# Altium footprint library ESKDPcbLib.PcbLib: 608 footprints (part 37 of 38)
Each footprint in its own frame and in the unit in brackets; x right, y up, seen from the top. Pads: shape width x height; smd on the part's side, far side on the other; paste and mask are expansions set on the pad; w line width, h text height; cw(c..) or ccw(c..) is an arc to the next point about the centre after c.
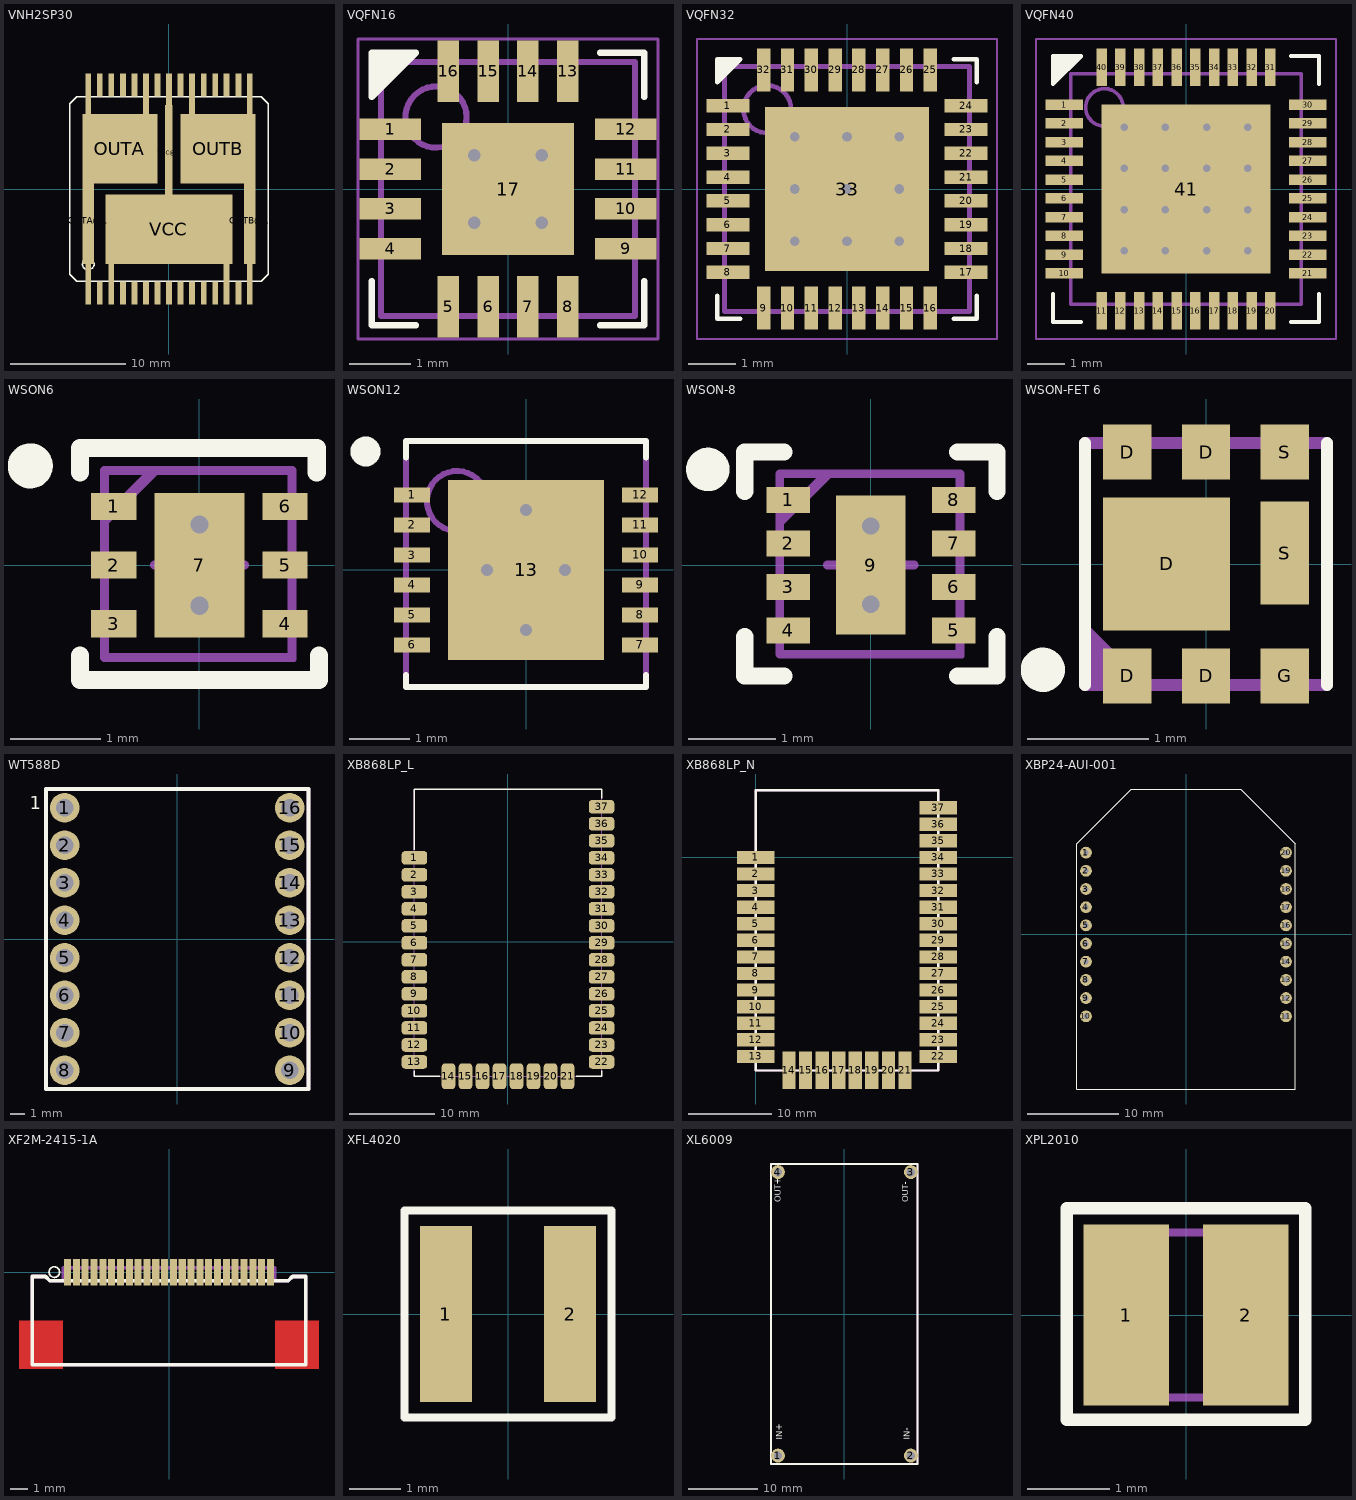
[diagram p36: the footprints below, top view; thin cyan lines are the x and y axes]

## VNH2SP30 [mil]
pads (36):
  rect 20x473 smd: 1(-275.59,-157.48) 15(276,-157.48) 16(276,158) 30(-275.59,158)
  rect 20x79 smd: 2(-236.22,-354.33) 4(-157.48,-354.33) 5(-118.11,-354.33) 6(-78.74,-354.33) 7(-39.37,-354.33) 8(0,-354.33) 9(40,-354.33) 10(79,-354.33) 11(119,-354.33) 12(158,-354.33) 14(237,-354.33) 17(237,355) 18(197,355) 19(158,355) 20(119,355) 22(40,355) 24(-39.37,355) 26(-118.11,355) 27(-157.48,355) 28(-196.85,355) 29(-236.22,355)
  rect 20x158 smd: 3(-196.85,-314.96) 13(197,-314.96) 21(79,315) 23(0,315) 25(-78.74,315)
  rect 256x237 smd: OUTA(-167.32,138) OUTB(168,138)
  rect 40x296 smd: OUTA@1(-275.59,-108.46) OUTB@1(276,-108.46)
  rect 434x237 smd: VCC(0,-137.8)
  rect 26x327 smd: VCC@1(0,124)
Top Overlay:
  circle w5: c-275.59,-255.91 r20
  lines w5: -338.58,-291.34 -314.96,-314.96 315,-314.96 339,-291.34 339,292 315,315 -314.96,315 -338.58,292 -338.58,-291.34
Top Paste:
  circle w0: c-236.22,217 r12
  circle w0: c-157.48,217 r12
  circle w0: c-78.74,217 r12
  circle w0: c79,217 r12
  circle w0: c158,217 r12
  circle w0: c237,217 r12
  circle w0: c-236.22,138 r12
  circle w0: c-157.48,138 r12
  circle w0: c-78.74,138 r12
  circle w0: c79,138 r12
  circle w0: c158,138 r12
  circle w0: c237,138 r12
  circle w0: c-236.22,60 r12
  circle w0: c-157.48,60 r12
  circle w0: c-78.74,60 r12
  circle w0: c79,60 r12
  circle w0: c158,60 r12
  circle w0: c237,60 r12
  circle w0: c-157.48,-59.06 r12
  circle w0: c-78.74,-59.06 r12
  circle w0: c0,-59.06 r12
  circle w0: c79,-59.06 r12
  circle w0: c158,-59.06 r12
  circle w0: c-157.48,-137.8 r12
  circle w0: c-78.74,-137.8 r12
  circle w0: c0,-137.8 r12
  circle w0: c79,-137.8 r12
  circle w0: c158,-137.8 r12
  circle w0: c-157.48,-216.54 r12
  circle w0: c-78.74,-216.54 r12
  circle w0: c0,-216.54 r12
  circle w0: c79,-216.54 r12
  circle w0: c158,-216.54 r12
  rectangle: -285.43,315 -265.75,394
  rectangle: -88.58,315 -68.9,394
  rectangle: -9.84,315 10,394
  rectangle: 69,315 89,394
  rectangle: 266,315 286,394
  region: -265.75,-314.76 -285.43,-314.76 -285.43,-393.5 -265.75,-393.5
  region: -187.01,-314.76 -206.69,-314.76 -206.69,-393.5 -187.01,-393.5
  region: 207,-314.76 188,-314.76 188,-393.5 207,-393.5
  region: 286,-314.76 266,-314.76 266,-393.5 286,-393.5
Top Solder:
  circle w0: c-236.22,217 r16
  circle w0: c-157.48,217 r16
  circle w0: c-78.74,217 r16
  circle w0: c79,217 r16
  circle w0: c158,217 r16
  circle w0: c237,217 r16
  circle w0: c-236.22,138 r16
  circle w0: c-157.48,138 r16
  circle w0: c-78.74,138 r16
  circle w0: c79,138 r16
  circle w0: c158,138 r16
  circle w0: c237,138 r16
  circle w0: c-236.22,60 r16
  circle w0: c-157.48,60 r16
  circle w0: c-78.74,60 r16
  circle w0: c79,60 r16
  circle w0: c158,60 r16
  circle w0: c237,60 r16
  circle w0: c-157.48,-59.06 r16
  circle w0: c-78.74,-59.06 r16
  circle w0: c0,-59.06 r16
  circle w0: c79,-59.06 r16
  circle w0: c158,-59.06 r16
  circle w0: c-157.48,-137.8 r16
  circle w0: c-78.74,-137.8 r16
  circle w0: c0,-137.8 r16
  circle w0: c79,-137.8 r16
  circle w0: c158,-137.8 r16
  circle w0: c-157.48,-216.54 r16
  circle w0: c-78.74,-216.54 r16
  circle w0: c0,-216.54 r16
  circle w0: c79,-216.54 r16
  circle w0: c158,-216.54 r16
  rectangle: -289.37,311 -261.81,398
  rectangle: -92.52,311 -64.96,398
  rectangle: -13.78,311 14,398
  rectangle: 65,311 93,398
  rectangle: 262,311 290,398
  region: -261.81,-310.83 -289.37,-310.83 -289.37,-397.44 -261.81,-397.44
  region: -183.07,-310.83 -210.63,-310.83 -210.63,-397.44 -183.07,-397.44
  region: 211,-310.83 184,-310.83 184,-397.44 211,-397.44
  region: 290,-310.83 262,-310.83 262,-397.44 290,-397.44

## VQFN16 [mm]
height 1
pads (17):
  rect 1x0.35 smd mask+0.05: 1(-1.925,0.975) 2(-1.925,0.325) 3(-1.925,-0.325) 4(-1.925,-0.975) 9(1.925,-0.975) 10(1.925,-0.325) 11(1.925,0.325) 12(1.925,0.975)
  rect 0.35x1 smd mask+0.05: 5(-0.975,-1.925) 6(-0.325,-1.925) 7(0.325,-1.925) 8(0.975,-1.925) 13(0.975,1.925) 14(0.325,1.925) 15(-0.325,1.925) 16(-0.975,1.925)
  rect 2.16x2.16 smd mask+0.05: 17(0,0)
via 0.55,-0.55 diameter 0.5 hole 0.2
via -0.55,-0.55 diameter 0.5 hole 0.2
via 0.55,0.55 diameter 0.5 hole 0.2
via -0.55,0.55 diameter 0.5 hole 0.2
Top Overlay:
  region: -2.225,2.225 -2.225,1.5 -1.5,2.225
  lines w0.1: -2.225,-1.5 -2.225,-2.225 -1.5,-2.225 ; 1.5,-2.225 2.225,-2.225 2.225,-1.5 ; 1.5,2.225 2.225,2.225 2.225,1.5 ; -2.225,1.5 -1.5,2.225 -2.225,2.225 -2.225,1.5
Mechanical 7:
  circle w0.1: c-1.175,1.175 r0.5
  lines w0.1: -2.075,-2.075 2.075,-2.075 2.075,2.075 -2.075,2.075 -2.075,-2.075
Mechanical 15:
  lines w0.05: -2.45,-2.45 2.45,-2.45 2.45,2.45 -2.45,2.45 -2.45,-2.45
  lines w0.1: -0.5,0 0.5,0 ; 0,-0.5 0,0.5
3D body: height 1, standoff 0.05, extent -2.075,-2.075 2.075,2.075

## VQFN32 [mm]
height 1
pads (33):
  rect 0.9x0.28 smd mask+0.05: 1(-2.5,1.75) 2(-2.5,1.25) 3(-2.5,0.75) 4(-2.5,0.25) 5(-2.5,-0.25) 6(-2.5,-0.75) 7(-2.5,-1.25) 8(-2.5,-1.75) 17(2.5,-1.75) 18(2.5,-1.25) 19(2.5,-0.75) 20(2.5,-0.25) 21(2.5,0.25) 22(2.5,0.75) 23(2.5,1.25) 24(2.5,1.75)
  rect 0.28x0.9 smd mask+0.05: 9(-1.75,-2.5) 10(-1.25,-2.5) 11(-0.75,-2.5) 12(-0.25,-2.5) 13(0.25,-2.5) 14(0.75,-2.5) 15(1.25,-2.5) 16(1.75,-2.5) 25(1.75,2.5) 26(1.25,2.5) 27(0.75,2.5) 28(0.25,2.5) 29(-0.25,2.5) 30(-0.75,2.5) 31(-1.25,2.5) 32(-1.75,2.5)
  rect 3.45x3.45 smd mask+0.05: 33(0,0)
via 1.1,-1.1 diameter 0.5 hole 0.2
via 0,-1.1 diameter 0.5 hole 0.2
via -1.1,-1.1 diameter 0.5 hole 0.2
via 1.1,0 diameter 0.5 hole 0.2
via 0,0 diameter 0.5 hole 0.2
via -1.1,0 diameter 0.5 hole 0.2
via 1.1,1.1 diameter 0.5 hole 0.2
via 0,1.1 diameter 0.5 hole 0.2
via -1.1,1.1 diameter 0.5 hole 0.2
Top Overlay:
  region: -2.725,2.725 -2.24,2.725 -2.725,2.24
  lines w0.1: -2.725,-2.24 -2.725,-2.725 -2.24,-2.725 ; 2.24,-2.725 2.725,-2.725 2.725,-2.24 ; 2.24,2.725 2.725,2.725 2.725,2.24 ; -2.725,2.24 -2.24,2.725 -2.725,2.725 -2.725,2.24
Mechanical 7:
  circle w0.1: c-1.675,1.675 r0.5
  lines w0.1: -2.575,-2.575 2.575,-2.575 2.575,2.575 -2.575,2.575 -2.575,-2.575
Mechanical 15:
  lines w0.05: -3.15,-3.15 3.15,-3.15 3.15,3.15 -3.15,3.15 -3.15,-3.15
  lines w0.1: -0.5,0 0.5,0 ; 0,-0.5 0,0.5
3D body: height 1, standoff 0.05, extent -2.575,-2.575 2.575,2.575

## VQFN40 [mm]
height 1
pads (41):
  rect 1x0.28 smd mask+0.05: 1(-3.25,2.25) 2(-3.25,1.75) 3(-3.25,1.25) 4(-3.25,0.75) 5(-3.25,0.25) 6(-3.25,-0.25) 7(-3.25,-0.75) 8(-3.25,-1.25) 9(-3.25,-1.75) 10(-3.25,-2.25) 22(3.25,-1.75) 23(3.25,-1.25) 24(3.25,-0.75) 25(3.25,-0.25) 26(3.25,0.25) 27(3.25,0.75) 28(3.25,1.25) 29(3.25,1.75) 30(3.25,2.25)
  rect 0.28x1 smd mask+0.05: 11(-2.25,-3.25) 12(-1.75,-3.25) 13(-1.25,-3.25) 14(-0.75,-3.25) 15(-0.25,-3.25) 16(0.25,-3.25) 17(0.75,-3.25) 18(1.25,-3.25) 19(1.75,-3.25) 20(2.25,-3.25) 31(2.25,3.25) 32(1.75,3.25) 33(1.25,3.25) 34(0.75,3.25) 35(0.25,3.25) 36(-0.25,3.25) 37(-0.75,3.25) 38(-1.25,3.25) 39(-1.75,3.25) 40(-2.25,3.25)
  rect 1x0.28 smd: 21(3.25,-2.25)
  rect 4.5x4.5 smd mask+0.05: 41(0,0)
via 1.65,-1.65 diameter 0.5 hole 0.2
via 0.55,-1.65 diameter 0.5 hole 0.2
via -0.55,-1.65 diameter 0.5 hole 0.2
via -1.65,-1.65 diameter 0.5 hole 0.2
via 1.65,-0.55 diameter 0.5 hole 0.2
via 0.55,-0.55 diameter 0.5 hole 0.2
via -0.55,-0.55 diameter 0.5 hole 0.2
via -1.65,-0.55 diameter 0.5 hole 0.2
via 1.65,0.55 diameter 0.5 hole 0.2
via 0.55,0.55 diameter 0.5 hole 0.2
via -0.55,0.55 diameter 0.5 hole 0.2
via -1.65,0.55 diameter 0.5 hole 0.2
via 1.65,1.65 diameter 0.5 hole 0.2
via 0.55,1.65 diameter 0.5 hole 0.2
via -0.55,1.65 diameter 0.5 hole 0.2
via -1.65,1.65 diameter 0.5 hole 0.2
Top Overlay:
  region: -3.55,3.55 -2.8,3.55 -3.55,2.8
  lines w0.1: -3.55,-2.79 -3.55,-3.55 -2.79,-3.55 ; -3.55,2.79 -3.55,3.55 -2.79,3.55 -3.55,2.8 ; 2.79,-3.55 3.55,-3.55 3.55,-2.79 ; 2.79,3.55 3.55,3.55 3.55,2.79
Mechanical 7:
  circle w0.1: c-2.175,2.175 r0.5
  lines w0.1: -3.075,-3.075 3.075,-3.075 3.075,3.075 -3.075,3.075 -3.075,-3.075
Mechanical 15:
  lines w0.05: -4,-4 4,-4 4,4 -4,4 -4,-4
  lines w0.1: -0.5,0 0.5,0 ; 0,-0.5 0,0.5
3D body: height 1, standoff 0.05, extent -3.075,-3.075 3.075,3.075

## WSON6 [mm] "PSON, 8-Leads, Body 4x4mm, Pitch 0.8mm, NSC Recommended"
height 0.8
pads (7):
  rect 0.5x0.3 smd mask+0.051: 1(-0.95,0.65) 2(-0.95,0) 3(-0.95,-0.65) 4(0.95,-0.65) 5(0.95,0) 6(0.95,0.65)
  rect 1x1.6 smd mask+0.051: 7(0,0)
via 0,0.45 diameter 0.5 hole 0.2
via 0,-0.45 diameter 0.5 hole 0.2
Top Overlay:
  circle w0.25: c-1.875,1.1 r0.125
  lines w0.2: -1.325,-1 -1.325,-1.275 -1,-1.275 1.325,-1.275 1.325,-1 ; -1.325,1.025 -1.325,1.3 -0.825,1.3 ; -0.875,1.3 1.3,1.3 1.3,1.025
Mechanical 7:
  lines w0.05: -1.05,0.45 -0.45,1.05 ; -1.025,0.525 -0.525,1.025 -0.575,1.025 -1.025,0.575 ; -1.05,-1.05 1.05,-1.05 1.05,1.05 -1.05,1.05 -1.05,-1.05
  lines w0.1: -0.5,0 0.5,0 ; 0,-0.5 0,0.5
Mechanical 9:
  lines w0.1: -1.05,-1.025 1.025,-1.025 1.025,1.05 -1.05,1.05 -1.05,-1.025
Mechanical 10:
  text ".Comment" at -1.025,1.775 h0.6
  text ".Designator" at -1.175,-2 h0.6
3D body: height 0.8, standoff 0, extent -1.05,-1.05 1.05,1.05

## WSON12 [mm] "PSON, 14-Leads, Body 4x4mm, Pitch 0.5mm, NSC Recommended"
height 0.8
pads (13):
  rect 0.6x0.25 smd paste-0.125 mask+0.051: 1(-1.9,1.25) 2(-1.9,0.75) 3(-1.9,0.25) 4(-1.9,-0.25) 5(-1.9,-0.75) 6(-1.9,-1.25) 7(1.9,-1.25) 8(1.9,-0.75) 9(1.9,-0.25) 10(1.9,0.25) 11(1.9,0.75) 12(1.9,1.25)
  rect 2.6x3 smd paste-1.3 mask+0.051: 13(0,0)
via 0,1 diameter 0.5 hole 0.2
via 0,-1 diameter 0.5 hole 0.2
via -0.65,0 diameter 0.5 hole 0.2
via 0.65,0 diameter 0.5 hole 0.2
Top Overlay:
  circle w0.25: c-2.675,1.975 r0.125
  lines w0.1: -2,-1.75 -2,-1.95 2,-1.95 2,-1.75 ; -2,1.875 -2,2.15 2,2.15 2,1.875
Top Paste:
  rectangle: -1.15,0.1 -0.125,1.4
  rectangle: -1.15,-1.4 -0.125,-0.1
  region: 1.15,-0.1 0.125,-0.1 0.125,-1.4 1.15,-1.4
  region: 1.15,1.4 0.125,1.4 0.125,0.1 1.15,0.1
  rectangle: 1.625,1.125 2.175,1.375
  rectangle: 1.625,0.625 2.175,0.875
  rectangle: 1.625,0.125 2.175,0.375
  rectangle: 1.625,-0.375 2.175,-0.125
  rectangle: 1.625,-0.875 2.175,-0.625
  rectangle: 1.625,-1.375 2.175,-1.125
  rectangle: -2.175,-1.375 -1.625,-1.125
  rectangle: -2.175,-0.875 -1.625,-0.625
  rectangle: -2.175,-0.375 -1.625,-0.125
  rectangle: -2.175,0.125 -1.625,0.375
  rectangle: -2.175,0.625 -1.625,0.875
  rectangle: -2.175,1.125 -1.625,1.375
Mechanical 7:
  lines w0.1: -0.5,0 0.5,0 ; 0,-0.5 0,0.5 ; -2,-1.95 -2,2.15 2,2.15 2,-1.95 -2,-1.95
Mechanical 9:
  circle w0.1: c-1.15,1.15 r0.5
  lines w0.1: -2,-1.95 2,-1.95 2,2.15 -2,2.15 -2,-1.95
Mechanical 10:
  text ".Designator" at -0.925,-2.575 h0.7
  text ".Comment" at -0.85,2.475 h0.7
3D body: height 0.8, standoff 0, extent -2,-1.949 2,2.149

## WSON-8 [mm] "PSON, 8-Leads, Body 4x4mm, Pitch 0.8mm, NSC Recommended"
height 0.8
pads (9):
  rect 0.5x0.3 smd mask+0.051: 1(-0.95,0.75) 2(-0.95,0.25) 3(-0.95,-0.25) 4(-0.95,-0.75) 5(0.95,-0.75) 6(0.95,-0.25) 7(0.95,0.25) 8(0.95,0.75)
  rect 0.8x1.6 smd mask+0.051: 9(0,0)
via 0,-0.45 diameter 0.5 hole 0.2
via 0,0.45 diameter 0.5 hole 0.2
Top Overlay:
  circle w0.25: c-1.875,1.1 r0.125
  lines w0.2: -1.45,-0.825 -1.45,-1.275 -1,-1.275 ; -1.45,0.85 -1.45,1.3 -1,1.3 ; 1,-1.275 1.45,-1.275 1.45,-0.825 ; 1,1.3 1.45,1.3 1.45,0.85
Mechanical 7:
  lines w0.05: -1.05,0.45 -0.45,1.05 ; -1.025,0.525 -0.525,1.025 -0.575,1.025 -1.025,0.575 ; -1.05,-1.05 -1.05,1.05 1.05,1.05 1.05,-1.05 -1.05,-1.05
  lines w0.1: -0.5,0 0.5,0 ; 0,-0.5 0,0.5
Mechanical 9:
  lines w0.1: -1.05,-1.025 -1.05,1.05 1.025,1.05 1.025,-1.025 -1.05,-1.025
Mechanical 10:
  text ".Designator" at -1.175,-2 h0.6
  text ".Comment" at -1.025,1.775 h0.6
3D body: height 0.8, standoff 0, extent -1.05,-1.05 1.05,1.05

## WSON-FET 6 [mm]
height 0.8
pads (8):
  rect 0.4x0.455 smd mask+0.05: D(-0.65,-0.925) D(-0.65,0.925) D(0,-0.925) D(0,0.925) G(0.65,-0.925) S(0.65,0.925)
  rect 1.05x1.1 smd mask+0.05: D(-0.325,0)
  rect 0.4x0.85 smd mask+0.05: S(0.65,0.09)
Top Overlay:
  circle w0.254: c-1.35,-0.875 r0.056
  lines w0.1: -1,-1 -1,1 ; 1,-1 1,1
Mechanical 7:
  lines w0.1: -1,-0.875 -0.888,-0.988 ; -1,-0.675 -0.7,-0.975 -0.8,-0.975 -0.986,-0.789 ; -0.993,-0.557 -0.55,-1 ; -1,-1 1,-1 1,1 -1,1 -1,-1
Mechanical 9:
  lines w0.1: -1,-1 -1,1 1,1 1,-1 -1,-1
Mechanical 10:
  text ".Designator" at -1.225,1.475 h0.8
  text ".Comment" at -1.125,-1.8 h0.8
3D body: height 0.8, standoff 0.05, extent -1,-1 1,1

## WT588D [mm]
pads (16):
  round 2 hole 1.2: 1(-7.62,8.89) 2(-7.62,6.35) 3(-7.62,3.81) 4(-7.62,1.27) 5(-7.62,-1.27) 6(-7.62,-3.81) 7(-7.62,-6.35) 8(-7.62,-8.89) 9(7.62,-8.89) 10(7.62,-6.35) 11(7.62,-3.81) 12(7.62,-1.27) 13(7.62,1.27) 14(7.62,3.81) 15(7.62,6.35) 16(7.62,8.89)
Top Overlay:
  lines w0.254: -8.89,-10.16 -8.89,10.16 8.89,10.16 8.89,-10.16 -8.89,-10.16
  text "1" at -10,8.5 h1.52
Mechanical 7:
  lines w0.254: -8.89,-10.16 -8.89,10.16 8.89,10.16 8.89,-10.16 -8.89,-10.16
Mechanical 10:
  text ".Comment" at -8.66,10.532 h1
  text ".Designator" at -8.66,11.532 h1

## XB868LP_L [mm]
height 3.1
pads (37):
  rrect50% 3x1.6 smd mask+0: 1(-11,9.84) 2(-11,7.84) 3(-11,5.84) 4(-11,3.84) 5(-11,1.84) 6(-11,-0.16) 7(-11,-2.16) 8(-11,-4.16) 9(-11,-6.16) 10(-11,-8.16) 11(-11,-10.16) 12(-11,-12.16) 13(-11,-14.16) 22(11,-14.16) 23(11,-12.16) 24(11,-10.16) 25(11,-8.16) 26(11,-6.16) 27(11,-4.16) 28(11,-2.16) 29(11,-0.16) 30(11,1.84) 31(11,3.84) 32(11,5.84) 33(11,7.84) 34(11,9.84) 35(11,11.84) 36(11,13.84) 37(11,15.84)
  rrect50% 1.6x3 smd mask+0: 14(-7,-15.84) 15(-5,-15.84) 16(-3,-15.84) 17(-1,-15.84) 18(1,-15.84) 19(3,-15.84) 20(5,-15.84) 21(7,-15.84)
Top Overlay:
  lines w0.15: -11,-15.2 -11,-15.84 -8.05,-15.84 ; -11,10.825 -11,17.94 11,17.94 11,16.825 ; 8.05,-15.84 11,-15.84 11,-15.2
Mechanical 7:
  lines w0.1: -11,-15.84 -11,17.94 11,17.94 11,-15.84 -11,-15.84
Mechanical 10:
  text ".Designator" at -1.275,1.15 h0.8
  text ".Comment" at -0.7,-0.75 h0.6
3D body: height 1, standoff 0, extent -11,9.84 11,17.94
3D body: height 3.1, standoff 0, extent -11,-15.84 11,9.84

## XB868LP_N [mm]
pads (37):
  rect 4.5x1.6 smd mask+0: 1(0,0) 2(0,-2) 3(0,-4) 4(0,-6) 5(0,-8) 6(0,-10) 7(0,-12) 8(0,-14) 9(0,-16) 10(0,-18) 11(0,-20) 12(0,-22) 13(0,-24) 22(22,-24) 23(22,-22) 24(22,-20) 25(22,-18) 26(22,-16) 27(22,-14) 28(22,-12) 29(22,-10) 30(22,-8) 31(22,-6) 32(22,-4) 33(22,-2) 34(22,0) 35(22,2) 36(22,4) 37(22,6)
  rect 1.6x4.5 smd mask+0: 14(4,-25.68) 15(6,-25.68) 16(8,-25.68) 17(10,-25.68) 18(12,-25.68) 19(14,-25.68) 20(16,-25.68) 21(18,-25.68)
Top Overlay:
  lines w0.254: 0,-25.68 22,-25.68 22,8.1 0,8.1 0,-25.68
Mechanical 1:
  lines w0.254: 0,-25.68 0,8.1 22,8.1 22,-25.68 0,-25.68
3D body: height 5, standoff 0, extent -0.127,-25.807 22.127,8.227

## XBP24-AUI-001 [mm]
pads (20):
  round 1.3 hole 0.6: 1(-11,9) 2(-11,7) 3(-11,5) 4(-11,3) 5(-11,1) 6(-11,-1) 7(-11,-3) 8(-11,-5) 9(-11,-7) 10(-11,-9) 11(11,-9) 12(11,-7) 13(11,-5) 14(11,-3) 15(11,-1) 16(11,1) 17(11,3) 18(11,5) 19(11,7) 20(11,9)
Top Overlay:
  lines w0.1: -12,10 -12,-17 12,-17 12,10 6,16 -6,16 -12,10 ; -12,10 -12,10
3D body: height 13.2, standoff -0.39, extent -12.1,-16.37 12.28,16.57

## XF2M-2415-1A [mm] "Rotary backlock connector (0.5 mm)"
height 3.4
pads (24):
  rect 0.4x1.5 smd mask+0.02: 1(-5.75,0) 2(-5.25,0) 3(-4.75,0) 4(-4.25,0) 5(-3.75,0) 6(-3.25,0) 7(-2.75,0) 8(-2.25,0) 9(-1.75,0) 10(-1.25,0) 11(-0.75,0) 12(-0.25,0) 13(0.25,0) 14(0.75,0) 15(1.25,0) 16(1.75,0) 17(2.25,0) 18(2.75,0) 19(3.25,0) 20(3.75,0) 21(4.25,0) 22(4.75,0) 23(5.25,0) 24(5.75,0)
Top Layer:
  rectangle: -8.5,-5.5 -6,-2.75
  rectangle: 6,-5.5 8.5,-2.75
Top Overlay:
  circle w0.1: c-6.5,0 r0.301
  lines w0.2: -7.75,-5.25 -7.75,-0.25 -7,-0.25 -6.75,-0.5 6.75,-0.5 7,-0.25 7.75,-0.25 7.75,-5.25 -7.75,-5.25
Top Solder:
  rectangle: -8.5,-5.5 -6,-2.75
  rectangle: 6,-5.5 8.5,-2.75
Mechanical 7:
  lines w0.2: -6,-0.5 -6,0.25 6,0.25 6,-0.5 ; -7.75,-5.25 7.75,-5.25 7.75,-0.25 7,-0.25 6.75,-0.5 -6.75,-0.5 -7,-0.25 -7.75,-0.25 -7.75,-5.25
Mechanical 10:
  text ".Comment" at -5.75,-5.75 h0.6
  text ".Designator" at -8.025,1.125 h0.8
3D body: height 0.2, standoff 0, extent 7.625,-4.85 7.925,-3.35
3D body: height 0.2, standoff 0, extent -7.95,-4.85 -7.65,-3.35
3D body: height 3.1, standoff 0, extent -7.65,-5.15 7.65,-0.575
3D body: height 0.3, standoff 0, extent 2.1,-0.6 2.4,0.35
3D body: height 0.3, standoff 0, extent 2.6,-0.6 2.9,0.35
3D body: height 0.3, standoff 0, extent 3.6,-0.6 3.9,0.35
3D body: height 0.3, standoff 0, extent 3.1,-0.6 3.4,0.35
3D body: height 0.3, standoff 0, extent 5.1,-0.6 5.4,0.35
3D body: height 0.3, standoff 0, extent 5.6,-0.6 5.9,0.35
3D body: height 0.3, standoff 0, extent 4.6,-0.6 4.9,0.35
3D body: height 0.3, standoff 0, extent 4.1,-0.6 4.4,0.35
3D body: height 0.3, standoff 0, extent -1.9,-0.6 -1.6,0.35
3D body: height 0.3, standoff 0, extent -1.4,-0.6 -1.1,0.35
3D body: height 0.3, standoff 0, extent -0.4,-0.6 -0.1,0.35
3D body: height 0.3, standoff 0, extent -0.9,-0.6 -0.6,0.35
3D body: height 0.3, standoff 0, extent 1.1,-0.6 1.4,0.35
3D body: height 0.3, standoff 0, extent 1.6,-0.6 1.9,0.35
3D body: height 0.3, standoff 0, extent 0.6,-0.6 0.9,0.35
3D body: height 0.3, standoff 0, extent 0.1,-0.6 0.4,0.35
3D body: height 0.3, standoff 0, extent -3.9,-0.6 -3.6,0.35
3D body: height 0.3, standoff 0, extent -3.4,-0.6 -3.1,0.35
3D body: height 0.3, standoff 0, extent -2.4,-0.6 -2.1,0.35
3D body: height 0.3, standoff 0, extent -2.9,-0.6 -2.6,0.35
3D body: height 0.3, standoff 0, extent -4.9,-0.6 -4.6,0.35
3D body: height 0.3, standoff 0, extent -4.4,-0.6 -4.1,0.35
3D body: height 0.3, standoff 0, extent -5.4,-0.6 -5.1,0.35
3D body: height 0.3, standoff 0, extent -5.9,-0.6 -5.6,0.35

## XFL4020 [mm]
height 2.1
pads (2):
  rect 1x3.4 smd: 1(-1.2,0) 2(1.2,0)
Top Overlay:
  lines w0.15: -2,-2 2,-2 2,2 -2,2 -2,-2
Mechanical 7:
  lines w0.1: -2,-2 -2,2 2,2 2,-2 -2,-2
Mechanical 10:
  text ".Designator" at -1.5,2.5 h0.8
  text ".Comment" at -1,-3 h0.6
3D body: height 2, standoff 0, extent -2,-2 2,2

## XL6009 [mm]
pads (4):
  round 2 hole 1.2: 1(-9.5,-20.3) 2(9.55,-20.3) 3(9.55,20.34) 4(-9.5,20.34)
Top Overlay:
  lines w0.254: -10.5,-21.5 10.5,-21.5 10.5,21.5 -10.5,21.5 -10.5,-21.5
  text "IN+" at -8.5,-18 h1.52
  text "IN-" at 9.77,-18 h1.52
  text "OUT-" at 9.5,16 h1.52
  text "OUT+" at -8.73,16 h1.52
Mechanical 7:
  lines w0.254: -10.5,-21.5 -10.5,21.5 10.5,21.5 10.5,-21.5 -10.5,-21.5
Mechanical 10:
  text ".Comment" at 1.34,23.032 h1
  text ".Designator" at 1.34,24.032 h1

## XPL2010 [mm]
height 1
pads (2):
  rect 1.04x2.2 smd: 1(-0.725,0) 2(0.725,0)
Top Overlay:
  lines w0.15: -1.45,-1.275 1.45,-1.275 1.45,1.3 -1.45,1.3 -1.45,-1.275
Mechanical 7:
  lines w0.1: -0.95,1 -0.95,-1.005 0.95,-1.005 0.95,1.005 -0.95,1.005
Mechanical 10:
  text ".Comment" at -1.425,-1.875 h0.6
  text ".Designator" at -1.425,1.55 h0.8
3D body: height 1, standoff 0, extent -0.95,-1.005 0.95,1.005